# Altium schematic symbol library CUSTOM SCH - Copy.SchLib: 494 symbols (part 5 of 6)
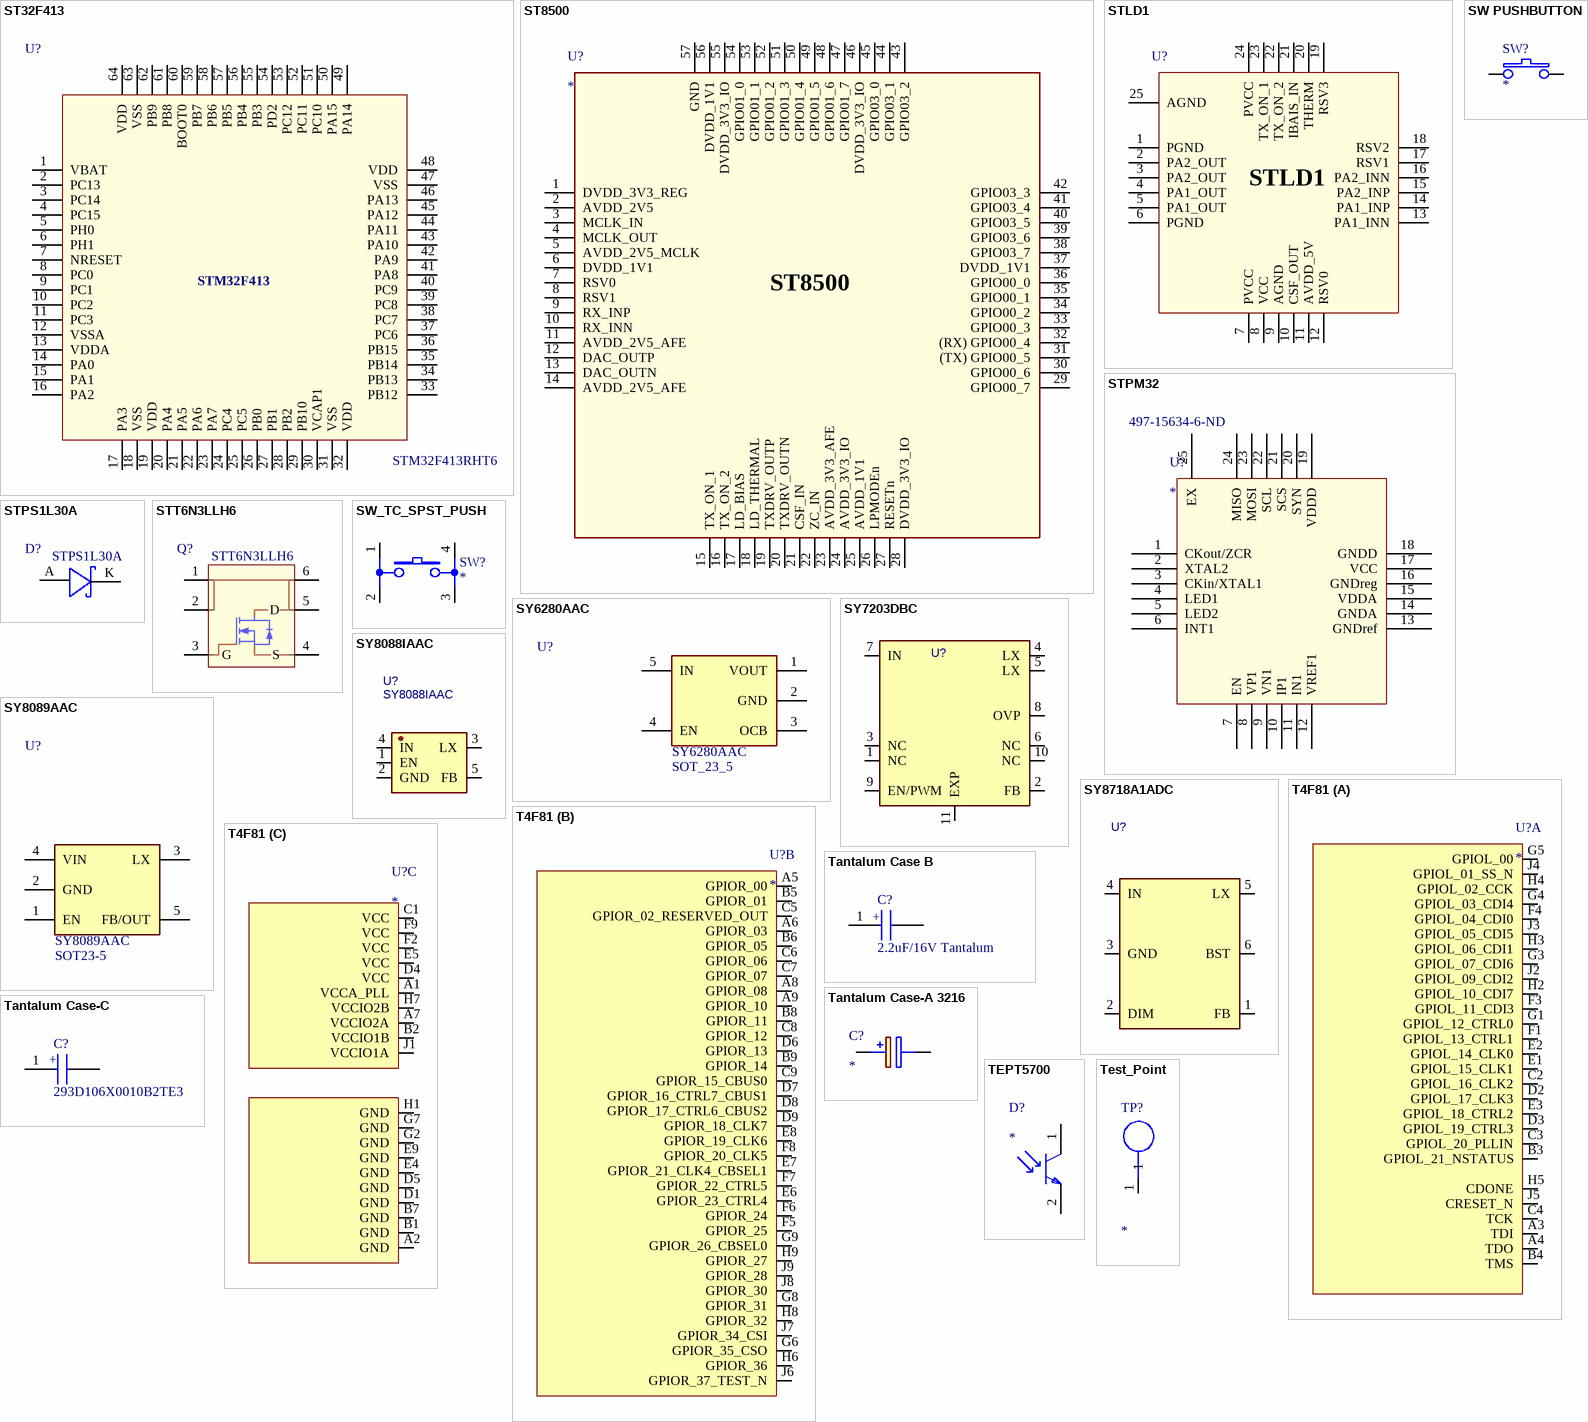
[diagram p53: symbols ST32F413 to Test_Point]

## STPM32
designator U?  Supplier Part Number 1: 497-15634-6-ND
Current & Power Monitors & Regulators Single Phase Metering ICs; Manufacturer: STMicroelectronics; Manufacturer Part Number: STPM32TR; Operating Supply Current: 3.9mA; Number of Channels: 2; Interface: SPI,Serial; Min Supply Voltage: 2.95V; Operating Supply Voltage: 3.3V; Max Supply Voltage: 3.65V; Accuracy: 0.5%; Supplier 1: Digi-Key; Stock 1: 8172; Pricing 1: 1=2.43, 10=2.186, 100=1.7573, 500=1.4438, 1000=1.1963 (USD); Mount: Surface Mount; Case/Package: QFN-24; Number of Pins: 24; Weight: 0.032741oz; Min Operating Temperature: -40°C; Max Operating Temperature: 85°C; Packaging: Tape and Reel; Package Quantity: 4000; Lead Free: Lead Free
footprint QFN24L (4x4x1) 0.5 pitch_STPM32
pins: 1 CKout/ZCR, 2 XTAL2, 3 CKin/XTAL1, 4 LED1, 5 LED2, 6 INT1, 7 EN, 8 VP1, 9 VN1, 10 IP1, 11 IN1, 12 VREF1, 13 GNDref, 14 GNDA, 15 VDDA, 16 GNDreg, 17 VCC, 18 GNDD, 19 VDDD, 20 SYN, 21 SCS, 22 SCL, 23 MOSI, 24 MISO, 25 EX

## STPS1L30A
designator D?  Manufacturer Part Number: STPS1L30A  (hidden comment: *)
Manufacturer: STMicroelectronics; Forward Current: 1A; Peak Reverse Current: 200uA; Max Repetitive Reverse Voltage (Vrrm): 30V; Peak Non-Repetitive Surge Current: 75A; Element Configuration: Single; Forward Voltage: 395mV; Polarity: Standard; Supplier 1: Digi-Key; Stock 1: 10180; Pricing 1: 1=0.45, 10=0.362, 100=0.2465, 500=0.1849, 1000=0.1387, 2500=0.1271 (USD); Mount: Surface Mount; Case/Package: SMA; Number of Pins: 2; Weight: 0.01lb; Contact Plating: Tin,Matte; Min Operating Temperature: -65°C; Max Operating Temperature: 150°C; Max Surge Current: 75A; Packaging: Tape and Reel; Package Quantity: 1; Max Reverse Leakage Current: 200uA; Average Rectified Current: 1A; Max Forward Surge Current (Ifsm): 75A; Voltage Rating (DC): 30V; Output Current: 1A; Current Rating: 1A; Max Reverse Voltage (DC): 30V; Length: 4.6mm; Height: 2.03mm; Width: 2.95mm; Radiation Hardening: No; REACH SVHC: No SVHC; Lead Free: Lead Free; ComponentLink1URL: http://www.farnell.com/datasheets/1690210.pdf?src-supplier=Farnell; ComponentLink1Description: http://www.farnell.com/datasheets/1690210.pdf?src-supplier=Farnell; ComponentLink2URL: http://www.st.com/web/en/resource/technical/document/datasheet/CD00001323.pdf?src-supplier=Future+Electronics; ComponentLink2Description: http://www.st.com/web/en/resource/technical/document/datasheet/CD00001323.pdf?src-supplier=Future+Electronics; ComponentLink3URL: http://www.st.com/st-web-ui/static/active/en/resource/technical/document/datasheet/CD00001323.pdf?src-supplier=Mouser; ComponentLink3Description: http://www.st.com/st-web-ui/static/active/en/resource/technical/document/datasheet/CD00001323.pdf?src-supplier=Mouser; ComponentLink4URL: http://www.st.com/content/ccc/resource/technical/document/datasheet/d4/83/f4/ff/dc/cc/48/7f/CD00001323.pdf/files/CD00001323.pdf/jcr:content/translations/en.CD00001323.pdf?src-supplier=Digi-Key; ComponentLink4Description: http://www.st.com/content/ccc/resource/technical/document/datasheet/d4/83/f4/ff/dc/cc/48/7f/CD00001323.pdf/files/CD00001323.pdf/jcr:content/translations/en.CD00001323.pdf?src-supplier=Digi-Key; ComponentLink5URL: http://www.farnell.com/datasheets/1690210.pdf?src-supplier=Element14; ComponentLink5Description: http://www.farnell.com/datasheets/1690210.pdf?src-supplier=Element14; Supplier Part Number 1: 497-6577-1-ND
footprint SMA
pins: A, K

## STT6N3LLH6
designator Q?  Manufacturer Part Number: STT6N3LLH6  (hidden comment: *)
Manufacturer: STMicroelectronics; Rise Time: 11.2ns; Rds On Max: 25mR; Input Capacitance: 283pF; Continuous Drain Current (ID): 6A; Drain to Source Breakdown Voltage: 30V; Fall Time: 5.4ns; Drain to Source Resistance: 40mR; Power Dissipation: 1.6W; Turn-Off Delay Time: 9.4ns; Turn-On Delay Time: 4.8ns; Element Configuration: Single; Gate to Source Voltage (Vgs): 20V; Supplier 1: Digi-Key; Stock 1: 0; Pricing 1: 3000=0.378, 6000=0.3591 (USD); Mount: Surface Mount; Case/Package: SOT-23-6; Number of Pins: 6; Min Operating Temperature: -55°C; Max Operating Temperature: 150°C; Packaging: Tape and Reel; Package Quantity: 3000; Drain to Source Voltage (Vdss): 30V; Max Power Dissipation: 1.6W; Length: 3.05mm; Height: 1.3mm; Width: 1.75mm; Radiation Hardening: No; Lead Free: Lead Free; ComponentLink1URL: http://www.mouser.com/ds/2/389/DM00051684-470726.pdf?src-supplier=Mouser; ComponentLink1Description: http://www.mouser.com/ds/2/389/DM00051684-470726.pdf?src-supplier=Mouser; ComponentLink2URL: http://www.st.com/web/en/resource/technical/document/datasheet/DM00051684.pdf?src-supplier=Avnet; ComponentLink2Description: http://www.st.com/web/en/resource/technical/document/datasheet/DM00051684.pdf?src-supplier=Avnet; ComponentLink3URL: http://www.st.com/content/ccc/resource/technical/document/datasheet/0f/e2/dd/d7/70/b0/47/68/DM00051684.pdf/files/DM00051684.pdf/jcr:content/translations/en.DM00051684.pdf?src-supplier=Digi-Key; ComponentLink3Description: http://www.st.com/content/ccc/resource/technical/document/datasheet/0f/e2/dd/d7/70/b0/47/68/DM00051684.pdf/files/DM00051684.pdf/jcr:content/translations/en.DM00051684.pdf?src-supplier=Digi-Key; Supplier Part Number 1: 497-13591-2-ND
footprint SOT-23-6
pins: 1 D, 2 D, 3 G, 4 S, 5 D, 6 D

## SW PUSHBUTTON
designator SW?
pins: 1, 2

## SW_TC_SPST_PUSH
designator SW?
PartNumber: 435-nnnnn
pins: 1, 2, 3, 4

## SY6280AAC
designator U?  Manufacturer Part Number: SY6280AAC  Case/Package: SOT_23_5
Low Loss Power Distribution Switch SY6280AAC
footprint SOT_23_5
footprint SOT23-5
pins: 1 VOUT, 2 GND, 3 OCB, 4 EN, 5 IN

## SY7203DBC
designator U?
Overvoltage protection(OVP) 1MHz PWM 4A -40℃~+85℃ boost 1 DC-DC,Step-Down 2.8V~30V DFN-10(3x3) LED Drivers; Manufacturer Part Number: SY7203DBC; Case/Package: DFN-10(3x3)
footprint DFN-10(3x3)
pins: 1 NC, 2 FB, 3 NC, 4 LX, 5 LX, 6 NC, 7 IN, 8 OVP, 9 EN/PWM, 10 NC, 11 EXP

## SY8088IAAC
designator U?
SOT-23-5 DC-DC Converters ROHS; Manufacturer Part Number: SY8088IAAC; Case/Package: SOT-23-5
footprint SOT-23-5
pins: 1 EN, 2 GND, 3 LX, 4 IN, 5 FB

## SY8089AAC
designator U?  Manufacturer Part Number: SY8089AAC  Case/Package: SOT23-5
High Efficiency 5.5V, 2A continuous, 3A peak, 1MHz Synchronous Step Down Regulator
footprint SOT_23_5
footprint SOT23-5
pins: 1 EN, 2 GND, 3 LX, 4 VIN, 5 FB/OUT

## SY8718A1ADC
designator U?
TSOT-23-6 LED Drivers ROHS; Manufacturer Part Number: SY8718A1ADC; Value: 6.8uH; Case/Package: TSOT-23-6
footprint TSOT-23-6 (SOT23, 3-Leads, Body 2.9x1.3mm, Pitch 0.95mm, Lead Span 2.5mm, IPC Low Density)
pins: 1 FB, 2 DIM, 3 GND, 4 IN, 5 LX, 6 BST

## T4F81
designator U?
Manufacturer_Part_Number: T4F81; Case/Package: *
part A pins: A3 TDI, A4 TDO, B3 GPIOL_21_NSTATUS, B4 TMS, C2 GPIOL_16_CLK2, C3 GPIOL_20_PLLIN, C4 TCK, D2 GPIOL_17_CLK3, D3 GPIOL_19_CTRL3, E1 GPIOL_15_CLK1, E2 GPIOL_14_CLK0, E3 GPIOL_18_CTRL2, F1 GPIOL_13_CTRL1, F3 GPIOL_11_CDI3, F4 GPIOL_04_CDI0, G1 GPIOL_12_CTRL0, G3 GPIOL_07_CDI6, G4 GPIOL_03_CDI4, G5 GPIOL_00, H2 GPIOL_10_CDI7, H3 GPIOL_06_CDI1, H4 GPIOL_02_CCK, H5 CDONE, J2 GPIOL_09_CDI2, J3 GPIOL_05_CDI5, J4 GPIOL_01_SS_N, J5 CRESET_N
part B pins: A5 GPIOR_00, A6 GPIOR_03, A8 GPIOR_08, A9 GPIOR_10, B5 GPIOR_01, B6 GPIOR_05, B8 GPIOR_11, B9 GPIOR_14, C5 GPIOR_02_RESERVED_OUT, C6 GPIOR_06, C7 GPIOR_07, C8 GPIOR_12, C9 GPIOR_15_CBUS0, D6 GPIOR_13, D7 GPIOR_16_CTRL7_CBUS1, D8 GPIOR_17_CTRL6_CBUS2, D9 GPIOR_18_CLK7, E6 GPIOR_23_CTRL4, E7 GPIOR_21_CLK4_CBSEL1, E8 GPIOR_19_CLK6, F5 GPIOR_25, F6 GPIOR_24, F7 GPIOR_22_CTRL5, F8 GPIOR_20_CLK5, G6 GPIOR_35_CSO, G8 GPIOR_31, G9 GPIOR_26_CBSEL0, H6 GPIOR_36, H8 GPIOR_32, H9 GPIOR_27, J6 GPIOR_37_TEST_N, J7 GPIOR_34_CSI, J8 GPIOR_30, J9 GPIOR_28
part C pins: A1 VCCA_PLL, A2 GND, A7 VCCIO2A, B1 GND, B2 VCCIO1B, B7 GND, C1 VCC, D1 GND, D4 VCC, D5 GND, E4 GND, E5 VCC, E9 GND, F2 VCC, F9 VCC, G2 GND, G7 GND, H1 GND, H7 VCCIO2B, J1 VCCIO1A

## Tantalum Case B
designator C?, comment 2.2uF/16V Tantalum
Tantalum Capacitors - Solid SMD 50V 2.2uF 10% 2312 ESR = 2.5 Ohms; Manufacturer_Name: AVX; Manufacturer_Part_Number: TAJC225K050RNJV; Geometry.Height: 2.8mm; Mfr. No: 2.2uF/16V Tantalum; Mouser Price/Stock: https://www.mouser.com/Search/Refine.aspx?Keyword=581-TAJC225K050RNJV; RS Part Number: 581-TAJC225K050RNJV; RS Price/Stock: https://www.mouser.com/Search/Refine.aspx?Keyword=581-TAJC225K050RNJV; Datasheet Link: http://www.farnell.com/datasheets/1680476.pdf
footprint Tantalum Case-B
pins: 1 +, 2 -

## Tantalum Case-A 3216
designator C?
uF, V, tantlum Cap Case-A 3216; Manufacturer Part Number: T495A336K006ATE600; Value: 10uF; Case/Package: Case-A_3216
footprint CAPPM3216X180N
pins: 1 +, 2 -

## Tantalum Case-C
designator C?, comment 293D106X0010B2TE3
VISHAY - 293D106X0010B2TE3 - TANTALUM CAPACITOR, 10UF 10V, 2.5 OHM, 0.2, 3528-21; Value: 2.2uF/16V Tantalum; Package: Case-B; Mfr. No: 2.2uF/16V Tantalum
footprint Tantalum Case-C
pins: 1 +, 2 -

## TEPT5700
designator D?
Ambient Phototransistor 5mm; Manufacturer Part Number: TEPT5700; Case/Package: 5mm TH
footprint TEPT5700
pins: 1 C, 2 E

## Test_Point
designator TP?  (no BOM)
footprint Test_smd
pins: 1

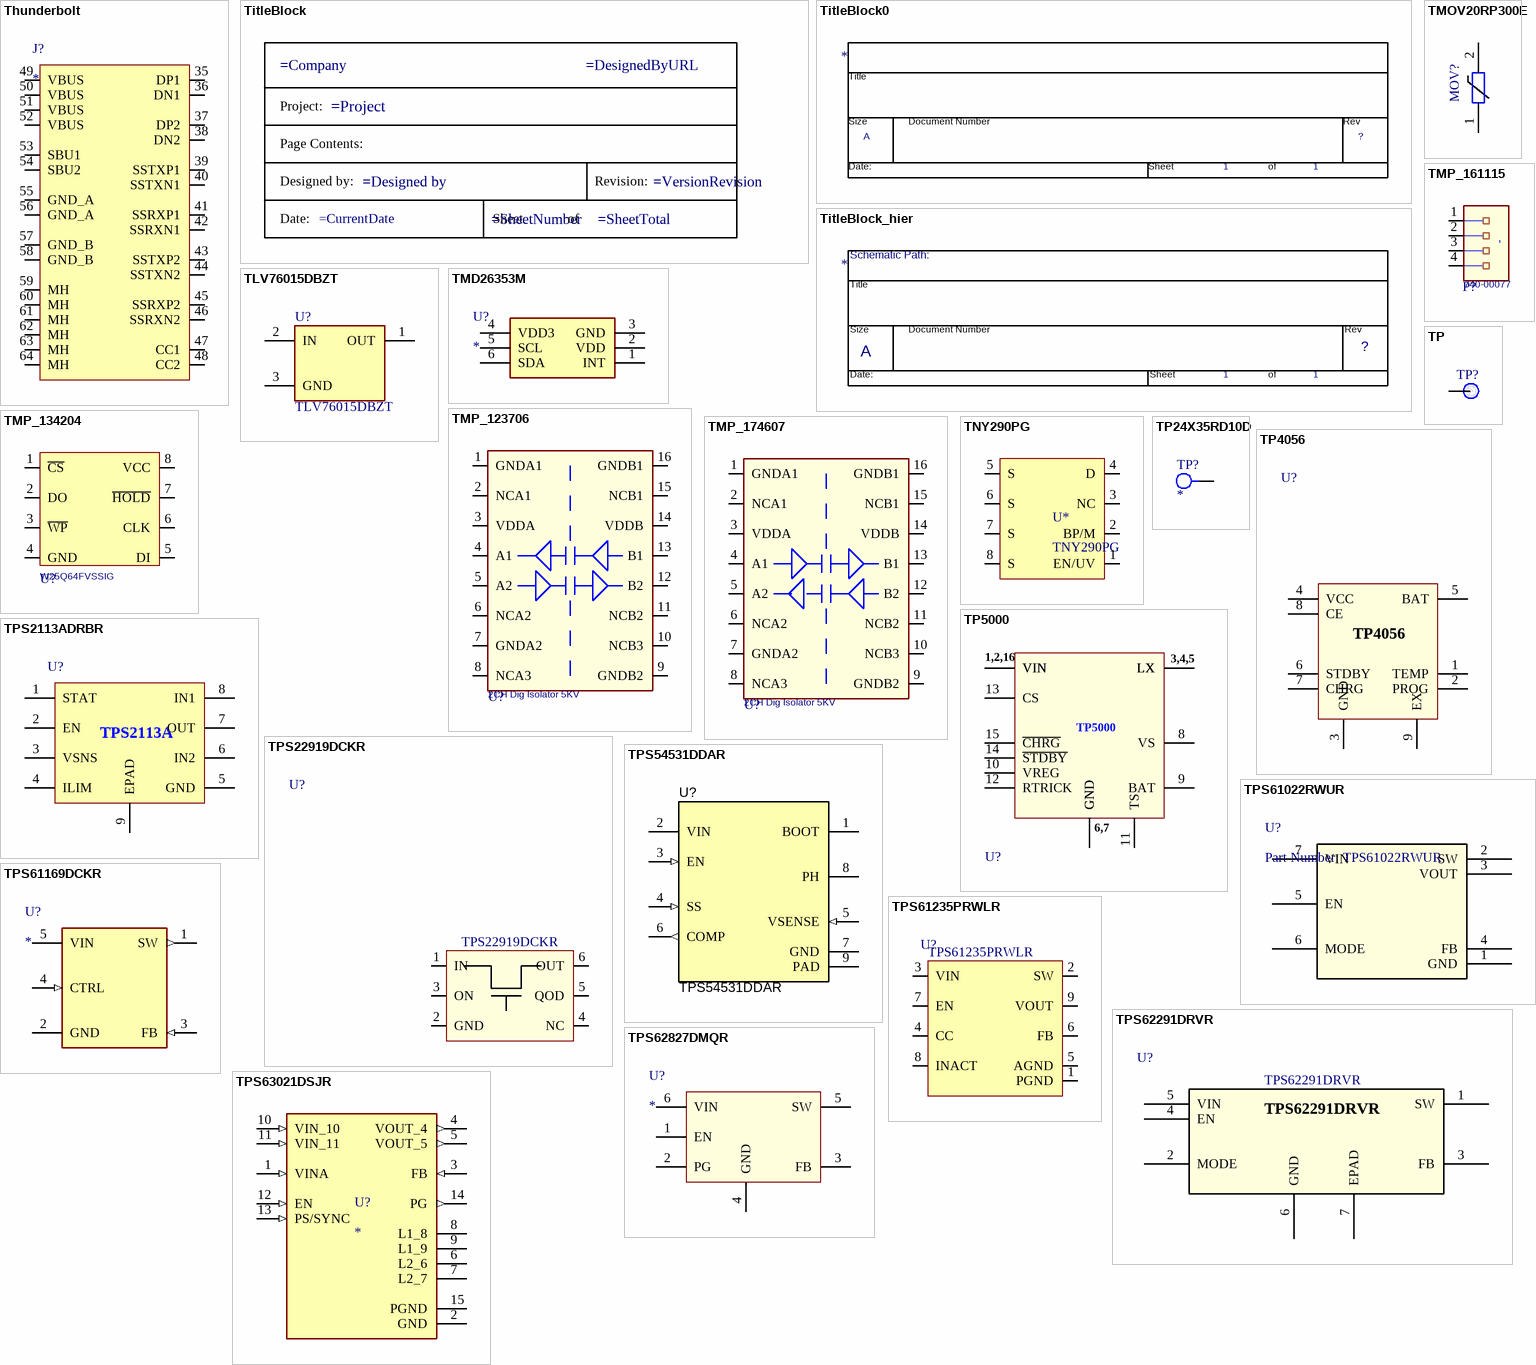
[diagram p41: symbols Thunderbolt to TPS63021DSJR]

## Thunderbolt
designator J?
pins: 35 DP1, 36 DN1, 37 DP2, 38 DN2, 39 SSTXP1, 40 SSTXN1, 41 SSRXP1, 42 SSRXN1, 43 SSTXP2, 44 SSTXN2, 45 SSRXP2, 46 SSRXN2, 47 CC1, 48 CC2, 49 VBUS, 50 VBUS, 51 VBUS, 52 VBUS, 53 SBU1, 54 SBU2, 55 GND_A, 56 GND_A, 57 GND_B, 58 GND_B, 59 MH, 60 MH, 61 MH, 62 MH, 63 MH, 64 MH

## TitleBlock
designator *  (value not drawn)  (graphical)
Standard Title Block
text: Project:; Page Contents:; Designed by:; Revision:; Date:; Sheet; of

## TitleBlock0
designator *  Page Count: 1  Page Size: A  (graphical)
Page Create Date: March  8, 1995; Page Number: 1; RevCode: ?
text: Title; Size; Document Number; Rev; Date:; Sheet; of

## TitleBlock_hier
designator *  Page Size: A  Page Number: 1  (graphical)
Page Create Date: March  8, 1995; RevCode: ?; Page Count: 1
text: Title; Size; Document Number; Rev; Date:; Sheet; of

## TLV76015DBZT
designator U?  Manufacturer Part Number: TLV76015DBZT
100-mA, 30-V wide-VIN, fixed-output linear voltage regulator 3-SOT-23 -40 to 125; Manufacturer: Texas Instruments; Output Type: Fixed; Output Configuration: Positive; Number of Regulators: 1; Max Input Voltage: 30V; Min Output Voltage: 15V; Dropout Voltage: 1.1V; Output Current: 100mA; Quiescent Current: 5mA; Supplier 1: Mouser; RoHS: Yes; Category: Voltage Regulators - Linear; Pricing 1: 1=1.03000, 10=0.92600, 25=0.87900, 50=0.87900, 100=0.72200, 250=0.67500, 500=0.59700, 1000=0.47000, 10000=0.47000 (USD); Mount: Surface Mount; Case/Package: TO-236-3; Min Operating Temperature: -40°C; Max Operating Temperature: 125°C; Packaging: Cut Tape; RoHS Compliant: Yes; ComponentLink1URL: http://www.ti.com/lit/ds/symlink/tlv760.pdf?src-supplier=Digi-Key; ComponentLink1Description: http://www.ti.com/lit/ds/symlink/tlv760.pdf?src-supplier=Digi-Key; ComponentLink2URL: http://www.ti.com/general/docs/suppproductinfo.tsp?distId=10&amp;gotoUrl=http%3A%2F%2Fwww.ti.com%2Flit%2Fgpn%2Ftlv760&src-supplier=Digi-Key; ComponentLink2Description: http://www.ti.com/general/docs/suppproductinfo.tsp?distId=10&amp;gotoUrl=http%3A%2F%2Fwww.ti.com%2Flit%2Fgpn%2Ftlv760&src-supplier=Digi-Key; Supplier Part Number 1: 595-TLV76015DBZT
footprint SOT23-3
pins: 1 OUT, 2 IN, 3 GND

## TMD26353M
designator U?
Proximity Sensors TMD26353M OLGA6 LF T&RDP; Manufacturer_Part_Number: TMD26353M; Case/Package: SMD/SMT
footprint TMD26353M
pins: 1 INT, 2 VDD, 3 GND, 4 VDD3, 5 SCL, 6 SDA

## TMOV20RP300E
designator MOV?  (value not drawn)
TMOV%C2%AE Series 517 VDC 300 V RMS 775 V Clamp 10000 A 800 pF Radial Lead Varistor; Manufacturer Part Number: MOV; Case/Package: TH
footprint mov - H
pins: 1, 2

## TMP_123706
designator U?, comment 2CH Dig Isolator 5KV
IC, 10 Mbps, Digital Isolator, 5kV(rms), Dual Ch, SO16W; Device: 461-00041
footprint SOIC127P10-16
pins: 1 GNDA1, 2 NCA1, 3 VDDA, 4 A1, 5 A2, 6 NCA2, 7 GNDA2, 8 NCA3, 9 GNDB2, 10 NCB3, 11 NCB2, 12 B2, 13 B1, 14 VDDB, 15 NCB1, 16 GNDB1

## TMP_134204
designator U?, comment W25Q64FVSSIG
Flash, Serial, 64Mbit, 2.7 - 3.6V, SPI, SO8; Device: 473-00015
footprint soic127p742-8
pins: 1 ~{CS}, 2 DO, 3 ~{WP}, 4 GND (power), 5 DI, 6 CLK, 7 ~{HOLD}, 8 VCC

## TMP_161115
designator P?, comment 740-00077
Conn, hdr, vert, male, .10 cl, 1 x 4 pos, TH; Device: 740-00077
footprint con_740-00077
pins: 1, 2, 3, 4

## TMP_174607
designator U?, comment 2CH Dig Isolator 5KV
IC, 10 Mbps, Digital Isolator, 5kV(rms), Dual Ch, SO16W; Device: 461-00041
footprint SOIC127P10-16
pins: 1 GNDA1, 2 NCA1, 3 VDDA, 4 A1, 5 A2, 6 NCA2, 7 GNDA2, 8 NCA3, 9 GNDB2, 10 NCB3, 11 NCB2, 12 B2, 13 B1, 14 VDDB, 15 NCB1, 16 GNDB1

## TNY290PG
designator U*
AC/DC Converters 28.5 W (85-265 VAC) 36.5 W (230 VAC); Mfr.: Power Integrations; PART NUMBER: TNY290PG; MOUSER NO.: 869-TNY290PG; Package/Case: DIP-8C
footprint TNY290PG (AC/DC Converters 28.5 W (85-265 VAC) 36.5 W (230 VAC))
pins: 1 EN/UV, 2 BP/M, 3 NC, 4 D, 5 S, 6 S, 7 S, 8 S

## TP
designator TP?  (no BOM)
TP
footprint TP (Tp)
footprint TP_TH
pins: 1 "TP"

## TP24X35RD10D
designator TP?
footprint TP24X35RD10D
pins: 1

## TP4056
designator U?  (value not drawn)
1A Standalone Linear Li-lon Battery Charger with Thermal / Regulation in SOP-8; Case/Package: SOP-8; Manufacturer Part Number: TP4056
footprint SOP-8_TP4056 (BAT charging TP4056)
pins: 1 TEMP, 2 PROG, 3 GND, 4 VCC, 5 BAT, 6 STDBY, 7 CHRG, 8 CE, 9 EX

## TP5000
designator U?
QFN-16_4x4x065P PMIC - Battery Management RoHS; Manufacturer Part Number: TP5000-QFN16; Case/Package: QFN-16_4x4x065P
footprint QFN-16_4x4x065P
pins: 1 VIN, 2 VIN, 3 LX, 4 LX, 5 LX, 6 GND, 7 GND, 8 VS, 9 BAT, 10 VREG, 11 TS, 12 RTRICK, 13 CS, 14 ~{STDBY}, 15 ~{CHRG}, 16 VIN
text: 1,2,16; 3,4,5; 6,7

## TPS2113ADRBR
designator U?  (value not drawn)
Power Switch ICs -Autoswitching Pwr Mux 3-mm × 3-mm SON-8; Manufacturer: Texas Instruments; Manufacturer Part Number: TPS2113ADRBR; Number of Inputs: 2; Number of Outputs: 1; Output Current: 1.25A; Max Input Voltage: 5.5V; Min Input Voltage: 2.8V; Turn-On Delay Time: 1ms; Supplier 1: Digi-Key; RoHS: Yes; Category: Integrated Circuits (ICs); Stock 1: 3232; Pricing 1: 1=1.95000, 10=1.74900, 25=1.65000, 100=1.32000, 250=1.15500, 500=1.12200, 1000=0.89100 (USD); Case/Package: SON-8 (3X3); Number of Pins: 8; Min Operating Temperature: -40°C; Max Operating Temperature: 85°C; Packaging: Tape and Reel; Package Quantity: 3000; Max Output Current: 1.25A; Current - Output 2: 1.25A; Operating Supply Voltage: 5.5V; Radiation Hardening: No; Lead Free: Lead Free; ComponentLink1URL: https://datasheet.ciiva.com/15109/getdatasheetpartid-627486-15109322.pdf?src-supplier=Verical; ComponentLink1Description: https://datasheet.ciiva.com/15109/getdatasheetpartid-627486-15109322.pdf?src-supplier=Verical; ComponentLink2URL: https://datasheet.ciiva.com/3232/tps2112a-3232522.pdf?src-supplier=Avnet; ComponentLink2Description: https://datasheet.ciiva.com/3232/tps2112a-3232522.pdf?src-supplier=Avnet; ComponentLink3URL: https://datasheet.ciiva.com/1961/tps2113a-1961004.pdf?src-supplier=Digi-Key; ComponentLink3Description: https://datasheet.ciiva.com/1961/tps2113a-1961004.pdf?src-supplier=Digi-Key; Supplier Part Number 1: 296-46373-1-ND
footprint SON-8
pins: 1 STAT, 2 EN, 3 VSNS, 4 ILIM, 5 GND, 6 IN2, 7 OUT, 8 IN1, 9 EPAD
text: TPS2113A

## TPS22919DCKR
designator U?
5.5-V, 1.5-A, 90-mΩ load switch with adj. output discharge 6-SC70 -40 to 105; Manufacturer 1: Texas Instruments; Supplier 1: Digi-Key; RoHS: No; Stock 1: 5365; Case/Package: SC70-6; Supplier Part Number 1: 296-TPS22919DCKRCT-ND; Manufacturer Part Number: TPS22919DCKR
pins: 1 IN, 2 GND, 3 ON, 4 NC, 5 QOD, 6 OUT

## TPS54531DDAR
designator U?
3.5V to 28V Input, 5A, 570kHz Step-Down Converter with Eco-mode, DDA0008E (SOIC-8); Alternate Manufacturer: Texas Instruments; Green_Lifecycle: Active; SizeAreaWB_mm2: 57.4; Green_REACh: Passed; U/M: EA; SizeZ_mm: 1.7; SizeX_mm: 5.0; SizeY_mm: 6.2; SizeArea_mm2: 31.0; CompType: IC; ComponentLink1URL: http://www.ti.com/lit/ds/symlink/tps54531.pdf; Alternate PartNumber: TPS54531DDA; Publisher: Texas Instruments; PackageDescription: SOIC-8; RoHS: Y; MountType: SMT; Green_EU RoHS-2: Passed; Manufacturer: Texas Instruments; Green_EU RoHS: Passed; PackageReference: DDA0008E; LatestRevisionDate: 2017-06-09; ComponentLink1Description: Datasheet Link; PartNumber: TPS54531DDAR
footprint DDA0008E_L (Footprint not found)
pins: 1 BOOT (power), 2 VIN (power), 3 EN (in), 4 SS (in), 5 VSENSE (in), 6 COMP (out), 7 GND, 8 PH (power), 9 PAD (power)

## TPS61022RWUR
designator U?, comment Part Number: TPS61022RWUR
No Description Available; Manufacturer: Texas Instruments; Supplier 1: Mouser; Manufacturer Part Number: TPS61022RWUR; Stock 1: 23607; Pricing 1: 1=1.68, 10=1.43, 100=1.14, 500=1, 1000=0.829, 3000=0.772, 6000=0.743, 9000=0.715 (USD); Supplier Part Number 1: 595-TPS61022RWUR
footprint VQFN7_2P1X2P1
pins: 1 GND, 2 SW, 3 VOUT, 4 FB, 5 EN, 6 MODE, 7 VIN

## TPS61169DCKR
designator U?
LED Driver IC 1 Output DC DC Regulator Step-Up (Boost) PWM Dimming 1.8A (Switch) SC-70-5; Manufacturer Part Number: TPS61169DCKR; Case/Package: SO70-5
footprint SC70-5
pins: 1 SW (out), 2 GND (power), 3 FB (in), 4 CTRL (in), 5 VIN (power)

## TPS61235PRWLR
designator U?
8-A Valley Current Synchronous Boost Converters with Constant Current Output; Manufacturer 1: Texas Instruments; Output Type: Fixed; Output Configuration: Positive; Quiescent Current: 10uA; Number of Outputs: 1; Min Input Voltage: 2.3V; Max Input Voltage: 4.5V; Min Output Voltage: 5.1V; Output Current: 6.5A; Switching Frequency: 1MHz; Synchronous Rectifier: Yes; ComponentLink1URL: http://www.ti.com/lit/pdf/slyt522?src-supplier=Digi-Key; ComponentLink1Description: http://www.ti.com/lit/pdf/slyt522?src-supplier=Digi-Key; ComponentLink2URL: http://www.ti.com/lit/ds/symlink/tps61235p.pdf?src-supplier=Digi-Key; ComponentLink2Description: http://www.ti.com/lit/ds/symlink/tps61235p.pdf?src-supplier=Digi-Key; Supplier 1: Digi-Key; RoHS: No; Category: Power Supply Modules; Stock 1: 3709; Pricing 1: 1=2.02000, 10=1.81800, 25=1.71520, 100=1.37200, 250=1.20052, 500=1.16620, 1000=0.92610 (USD); Mount: Surface Mount; Case/Package: VQFN-9; Number of Pins: 9; Min Operating Temperature: -40°C; Max Operating Temperature: 85°C; Topology: Boost; Packaging: Tape and Reel; Lead Free: Lead Free; ComponentLink3URL: http://www.ti.com/general/docs/suppproductinfo.tsp?distId=10&amp;gotoUrl=http%3A%2F%2Fwww.ti.com%2Flit%2Fgpn%2Ftps61235p&src-supplier=Digi-Key; ComponentLink3Description: http://www.ti.com/general/docs/suppproductinfo.tsp?distId=10&amp;gotoUrl=http%3A%2F%2Fwww.ti.com%2Flit%2Fgpn%2Ftps61235p&src-supplier=Digi-Key; Supplier Part Number 1: 296-47376-1-ND; Manufacturer Part Number: TPS61235PRWLR
pins: 1 PGND, 2 SW, 3 VIN, 4 CC, 5 AGND, 6 FB, 7 EN, 8 INACT, 9 VOUT
